# Altium footprint library AD_Lib.PcbLib: 508 footprints (part 15 of 32)
Each footprint in its own frame and in the unit in brackets; x right, y up, seen from the top. Pads: shape width x height; smd on the part's side, far side on the other; paste and mask are expansions set on the pad; w line width, h text height; cw(c..) or ccw(c..) is an arc to the next point about the centre after c.
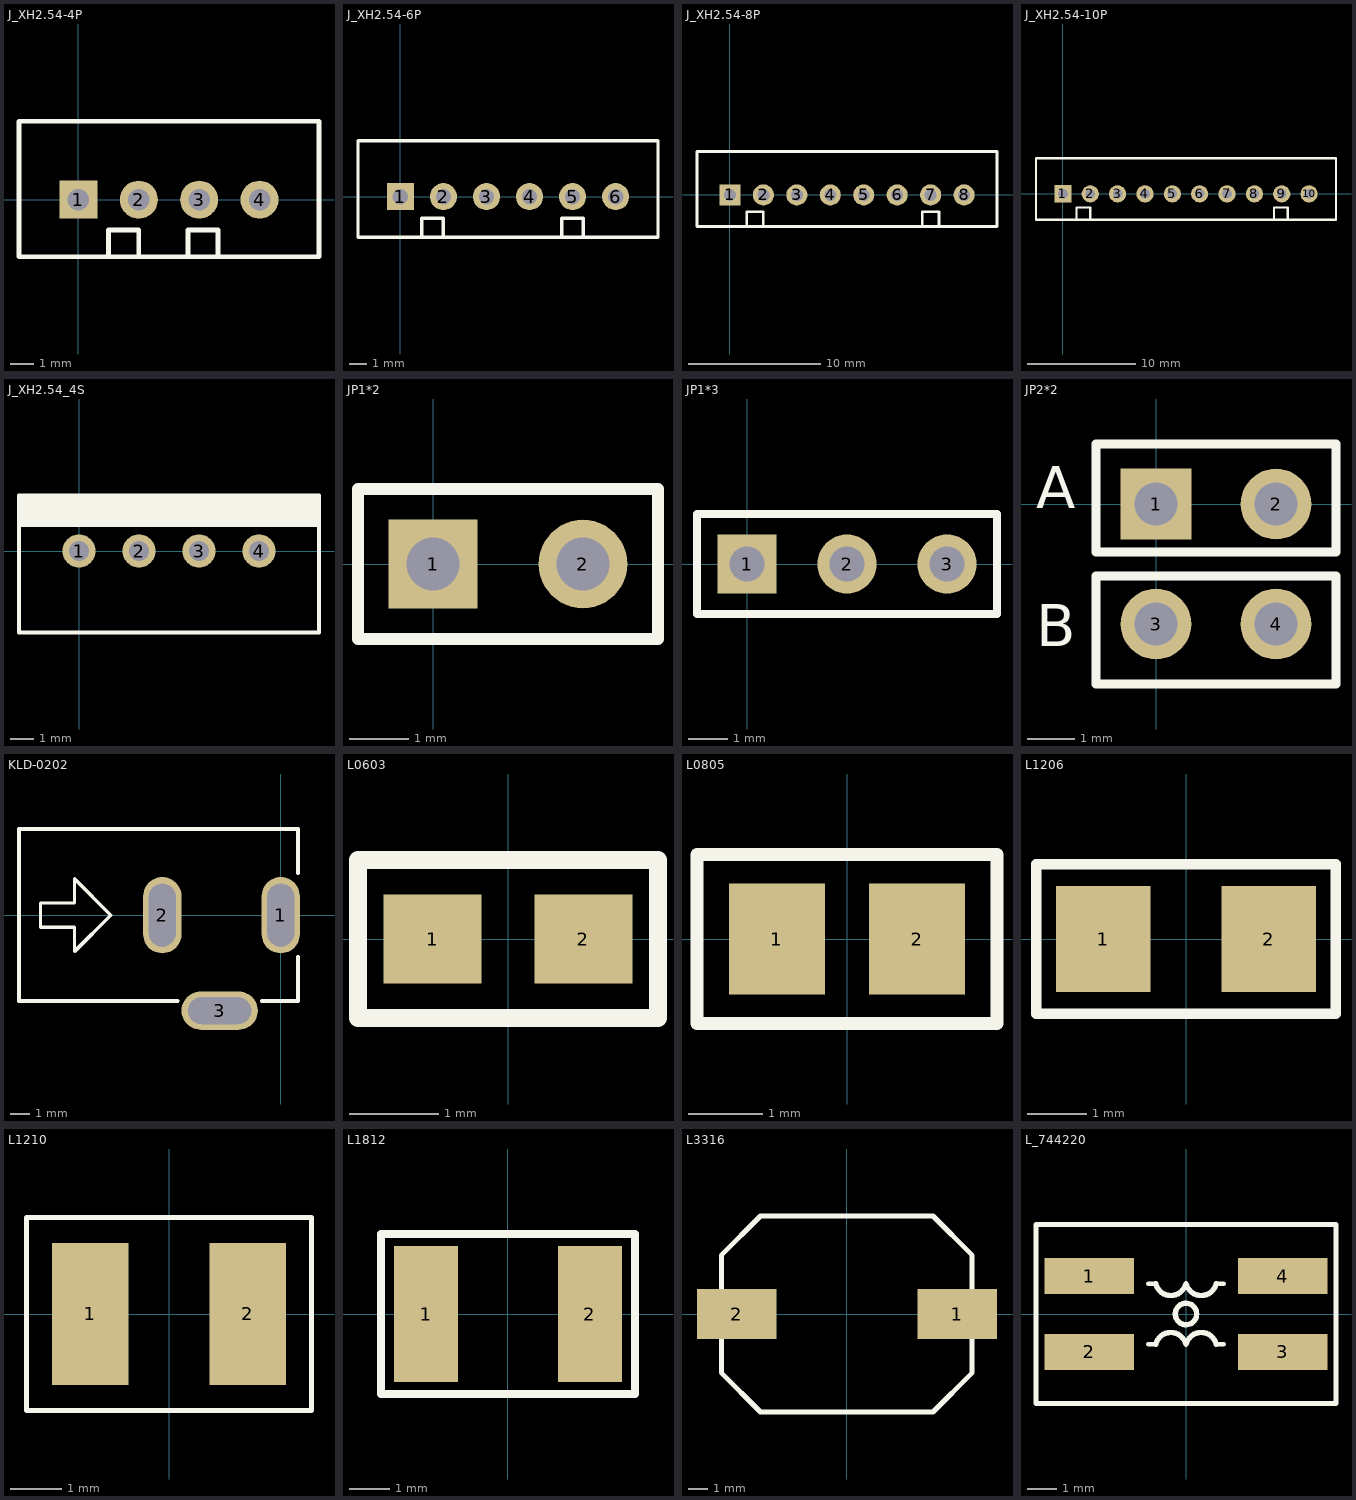
[diagram p14: the footprints below, top view; thin cyan lines are the x and y axes]

## J_XH2.54-4P [mm] "单排插座"
height 2.642
pads (4):
  rect 1.6x1.6 hole 0.9: 1(0,0)
  round 1.6 hole 0.9: 2(2.54,0) 3(5.08,0) 4(7.62,0)
Top Overlay:
  lines w0.2: 1.27,-2.4 1.27,-1.27 2.54,-1.27 2.54,-2.4 ; 4.605,-2.4 4.605,-1.27 5.875,-1.27 5.875,-2.4 ; -2.5,-2.4 10.12,-2.4 10.12,3.3 -2.5,3.3 -2.5,-2.4

## J_XH2.54-6P [mm] "单排插座"
height 2.642
pads (6):
  rect 1.6x1.6 hole 0.9: 1(0,0)
  round 1.6 hole 0.9: 2(2.54,0) 3(5.08,0) 4(7.62,0) 5(10.16,0) 6(12.7,0)
Top Overlay:
  lines w0.2: 1.27,-2.4 1.27,-1.27 2.54,-1.27 2.54,-2.4 ; 9.525,-2.4 9.525,-1.27 10.795,-1.27 10.795,-2.4 ; -2.5,-2.4 -2.5,3.3 15.2,3.3 15.2,-2.4 -2.5,-2.4

## J_XH2.54-8P [mm] "单排插座"
height 2.642
pads (8):
  rect 1.6x1.6 hole 0.9: 1(0,0)
  round 1.6 hole 0.9: 2(2.54,0) 3(5.08,0) 4(7.62,0) 5(10.16,0) 6(12.7,0) 7(15.24,0) 8(17.78,0)
Top Overlay:
  lines w0.2: 1.27,-2.4 1.27,-1.27 2.54,-1.27 2.54,-2.4 ; 14.605,-2.4 14.605,-1.27 15.875,-1.27 15.875,-2.4 ; 20.28,-2.4 -2.5,-2.4 -2.5,3.3 20.28,3.3 ; 20.28,-2.4 20.28,3.3

## J_XH2.54-10P [mm] "单排插座"
height 2.642
pads (10):
  rect 1.6x1.6 hole 0.9: 1(0,0)
  round 1.6 hole 0.9: 2(2.54,0) 3(5.08,0) 4(7.62,0) 5(10.16,0) 6(12.7,0) 7(15.24,0) 8(17.78,0) 9(20.32,0) 10(22.86,0)
Top Overlay:
  lines w0.2: 1.27,-2.4 1.27,-1.27 2.54,-1.27 2.54,-2.4 ; 19.605,-2.4 19.605,-1.27 20.875,-1.27 20.875,-2.4 ; -2.5,-2.4 -2.5,3.3 25.36,3.3 25.36,-2.4 -2.5,-2.4

## J_XH2.54_4S [mm] "引脚间距2.54mm，直针"
height 7.2
pads (4):
  round 1.4 hole 0.85: 1(0,0) 2(2.54,0) 3(5.08,0) 4(7.62,0)
Top Overlay:
  rectangle: -2.54,1.016 10.16,2.286
  lines w0.178: -2.54,-3.45 10.16,-3.45 ; -2.54,-3.429 -2.54,2.286 ; -2.54,2.35 10.16,2.35 ; 10.16,-3.429 10.16,2.286

## JP1*2 [mm] "跳线，1个"
height 5
pads (2):
  rect 1.5x1.5 hole 0.9: 1(0,0)
  round 1.5 hole 0.9: 2(2.54,0)
Top Overlay:
  lines w0.2: -1.27,-1.27 3.81,-1.27 3.81,1.27 -1.27,1.27 -1.27,-1.27

## JP1*3 [mm] "跳线，1个"
height 5
pads (3):
  rect 1.5x1.5 hole 0.9: 1(0,0)
  round 1.5 hole 0.9: 2(2.54,0) 3(5.08,0)
Top Overlay:
  lines w0.2: -1.27,-1.27 6.35,-1.27 6.35,1.27 -1.27,1.27 -1.27,-1.27

## JP2*2 [mm] "跳线，2个"
height 5
pads (4):
  rect 1.5x1.5 hole 0.9: 1(0,0)
  round 1.5 hole 0.9: 2(2.54,0) 3(0,-2.54) 4(2.54,-2.54)
Top Overlay:
  lines w0.2: -1.27,-3.81 3.81,-3.81 3.81,-1.524 -1.27,-1.524 -1.27,-3.81 ; -1.27,-1.016 3.81,-1.016 3.81,1.27 -1.27,1.27 -1.27,-1.016
  text "A" at -2.54,-0.381 h1.52
  text "B" at -2.54,-3.302 h1.52

## KLD-0202 [mm] "DC Power Jack, 2.5mm, KLD Series, PCB Mount"
height 5.08
pads (3):
  oval 2x4 hole 1.397 slot 3.302 at 90 deg: 1(0,0) 2(-6.2,0)
  oval 4x2 hole 1.397 slot 3.302 at 0 deg: 3(-3.2,-5)
Top Overlay:
  lines w0.178: -12.573,-0.635 -12.573,0.635 -10.795,0.635 -10.795,1.905 -8.89,0 -10.795,-1.905 -10.795,-0.635 -12.573,-0.635
  lines w0.2: -5.4,-4.5 -13.7,-4.5 -13.7,4.5 0.9,4.5 0.9,2.2 ; -1,-4.5 0.9,-4.5 0.9,-2.2

## L0603 [mm] "贴片电感"
height 1.1
pads (2):
  rect 1.1x1 smd: 1(-0.85,0) 2(0.85,0)
Top Overlay:
  lines w0.2: -1.69,-0.889 -1.69,0.889 1.69,0.889 1.69,-0.889 -1.69,-0.889

## L0805 [mm] "贴片磁珠"
height 1.1
pads (2):
  rect 1.3x1.5 smd: 1(-0.95,0) 2(0.95,0)
Top Overlay:
  lines w0.178: -2.032,-1.143 0,-1.143 2.032,-1.143 2.032,1.143 0,1.143 -2.032,1.143 -2.032,-1.143

## L1206 [mm] "贴片磁珠"
height 1.3
pads (2):
  rect 1.6x1.8 smd: 1(-1.4,0) 2(1.4,0)
Top Overlay:
  lines w0.178: -2.54,-1.27 -2.54,1.27 2.54,1.27 2.54,-1.27 -2.54,-1.27

## L1210 [mm] "公制3225；英制1210；功率1/3W"
height 0.71
pads (2):
  rect 1.5x2.8 smd: 1(-1.55,0) 2(1.55,0)
Top Overlay:
  lines w0.1: -2.8,-1.9 2.8,-1.9 2.8,1.9 -2.8,1.9 -2.8,-1.9

## L1812 [mm] "公制4832；英制1812；功率1/2W"
height 0.7
pads (2):
  rect 1.6x3.4 smd: 1(-2.05,0) 2(2.05,0)
Top Overlay:
  lines w0.2: -3.175,-2 3.175,-2 3.175,2 -3.175,2 -3.175,-2

## L3316 [mil] "电感，150uH"
height 43.31
pads (2):
  rect 160x100 smd: 1(222,0) 2(-221,0)
Top Overlay:
  lines w10: -251.97,-118.11 -251.97,118.11 -173.23,196.85 173.23,196.85 251.97,118.11 251.97,-118.11 173.23,-196.85 -173.23,-196.85 -251.97,-118.11

## L_744220 [mm] "Wuth之共模电感"
height 5
pads (4):
  rect 3x1.2 smd: 1(-3.25,1.27) 2(-3.25,-1.27) 3(3.25,-1.27) 4(3.25,1.27)
Top Overlay:
  circle w0.178: c0,0 r0.359
  lines w0.152: -1.27,-1.016 -1.016,-1.016 ; -1.27,1.016 -1.016,1.016 ; 1.016,-1.016 1.27,-1.016 ; 1.016,1.016 1.27,1.016
  lines w0.178: -1.016,-1.016 cw(c-0.508,-1.143) 0,-1.016 cw(c0.508,-1.143) 1.016,-1.016 ; -1.016,1.016 ccw(c-0.508,1.143) 0,1.016 ccw(c0.508,1.143) 1.016,1.016 ; -5.028,-3 -5.028,3 5.028,3 5.028,-3 -5.028,-3